# Altium footprint library WE Inductors.PcbLib: 131 footprints (part 9 of 9)
Each footprint in its own frame and in the unit in brackets; x right, y up, seen from the top. Pads: shape width x height; smd on the part's side, far side on the other; paste and mask are expansions set on the pad; w line width, h text height; cw(c..) or ccw(c..) is an arc to the next point about the centre after c.
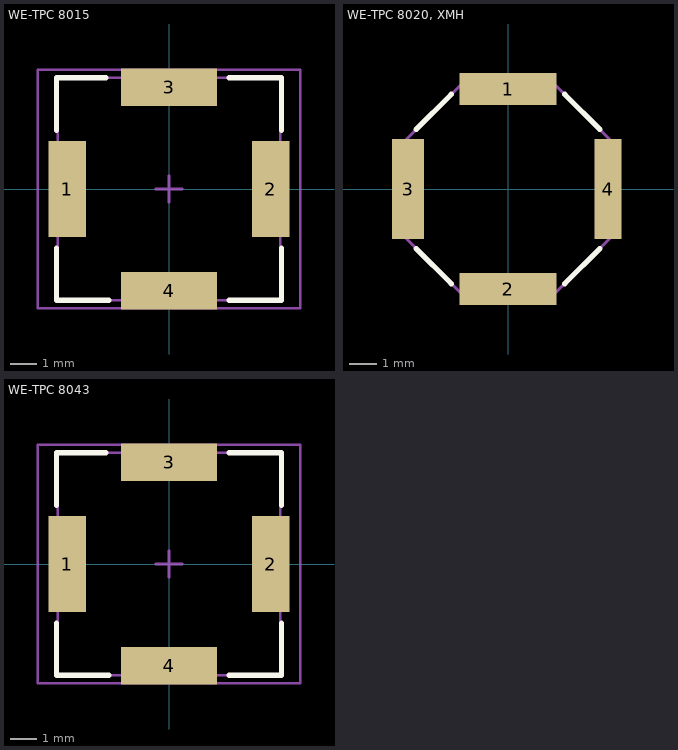
[diagram p8: the footprints below, top view; thin cyan lines are the x and y axes]

## WE-TPC 8015 [mm] "SMD Inductor, 2-Leads, Body 8,0x8,0mm"
height 1.5
pads (4):
  rect 1.4x3.6 smd: 1(-3.8,0) 2(3.8,0)
  rect 3.6x1.4 smd: 3(0,3.8) 4(0,-3.8)
Top Overlay:
  lines w0.2: -4.2,-2.2 -4.2,-4.15 -2.25,-4.15 ; -4.2,2.2 -4.2,4.15 -2.35,4.15 ; 2.25,-4.15 4.2,-4.15 4.2,-2.2 ; 2.25,4.15 4.2,4.15 4.2,2.2
Mechanical 13:
  lines w0.1: -4.15,-4.15 4.15,-4.15 4.15,4.15 -4.15,4.15 -4.15,-4.15
Mechanical 15:
  lines w0.1: -0.5,0 0.5,0 ; 0,-0.5 0,0.5 ; -4.9,-4.45 4.9,-4.45 4.9,4.45 -4.9,4.45 -4.9,-4.45
3D body: height 1.34, standoff -0.01, extent -4,-4 4,4

## WE-TPC 8020, XMH [mm] "SMD Inductor, 2-Leads, Body 8x8mm"
height 2
pads (4):
  rect 3.6x1.2 smd: 1(0,3.7) 2(0,-3.7)
  rect 1.2x3.7 smd: 3(-3.7,0)
  rect 1x3.7 smd: 4(3.7,0)
Top Overlay:
  lines w0.2: -3.4,-2.2 -2.1,-3.5 ; -3.4,2.2 -2.1,3.5 ; 2.1,-3.5 3.4,-2.2 ; 2.1,3.5 3.4,2.2
Mechanical 1:
  lines w0.1: -4,-1.6 -4,1.6 -1.6,4 1.6,4 4,1.6 4,-1.6 1.6,-4 -1.6,-4 -4,-1.6
3D body: height 1.79, standoff -0.01, extent -4,-4 4,4

## WE-TPC 8043 [mm] "SMD Inductor, 2-Leads, Body 8,0x8,0mm"
height 4.3
pads (4):
  rect 1.4x3.6 smd: 1(-3.8,0) 2(3.8,0)
  rect 3.6x1.4 smd: 3(0,3.8) 4(0,-3.8)
Top Overlay:
  lines w0.2: -4.2,-2.2 -4.2,-4.15 -2.25,-4.15 ; -4.2,2.2 -4.2,4.15 -2.35,4.15 ; 2.25,-4.15 4.2,-4.15 4.2,-2.2 ; 2.25,4.15 4.2,4.15 4.2,2.2
Mechanical 13:
  lines w0.1: -4.15,-4.15 4.15,-4.15 4.15,4.15 -4.15,4.15 -4.15,-4.15
Mechanical 15:
  lines w0.1: -0.5,0 0.5,0 ; 0,-0.5 0,0.5 ; -4.9,-4.45 4.9,-4.45 4.9,4.45 -4.9,4.45 -4.9,-4.45
3D body: height 4.28, standoff -0.02, extent -4,-4 4,4